# Altium footprint library Hydra_Ref_pcb.PcbLib: 353 footprints (part 11 of 23)
Each footprint in its own frame and in the unit in brackets; x right, y up, seen from the top. Pads: shape width x height; smd on the part's side, far side on the other; paste and mask are expansions set on the pad; w line width, h text height; cw(c..) or ccw(c..) is an arc to the next point about the centre after c.
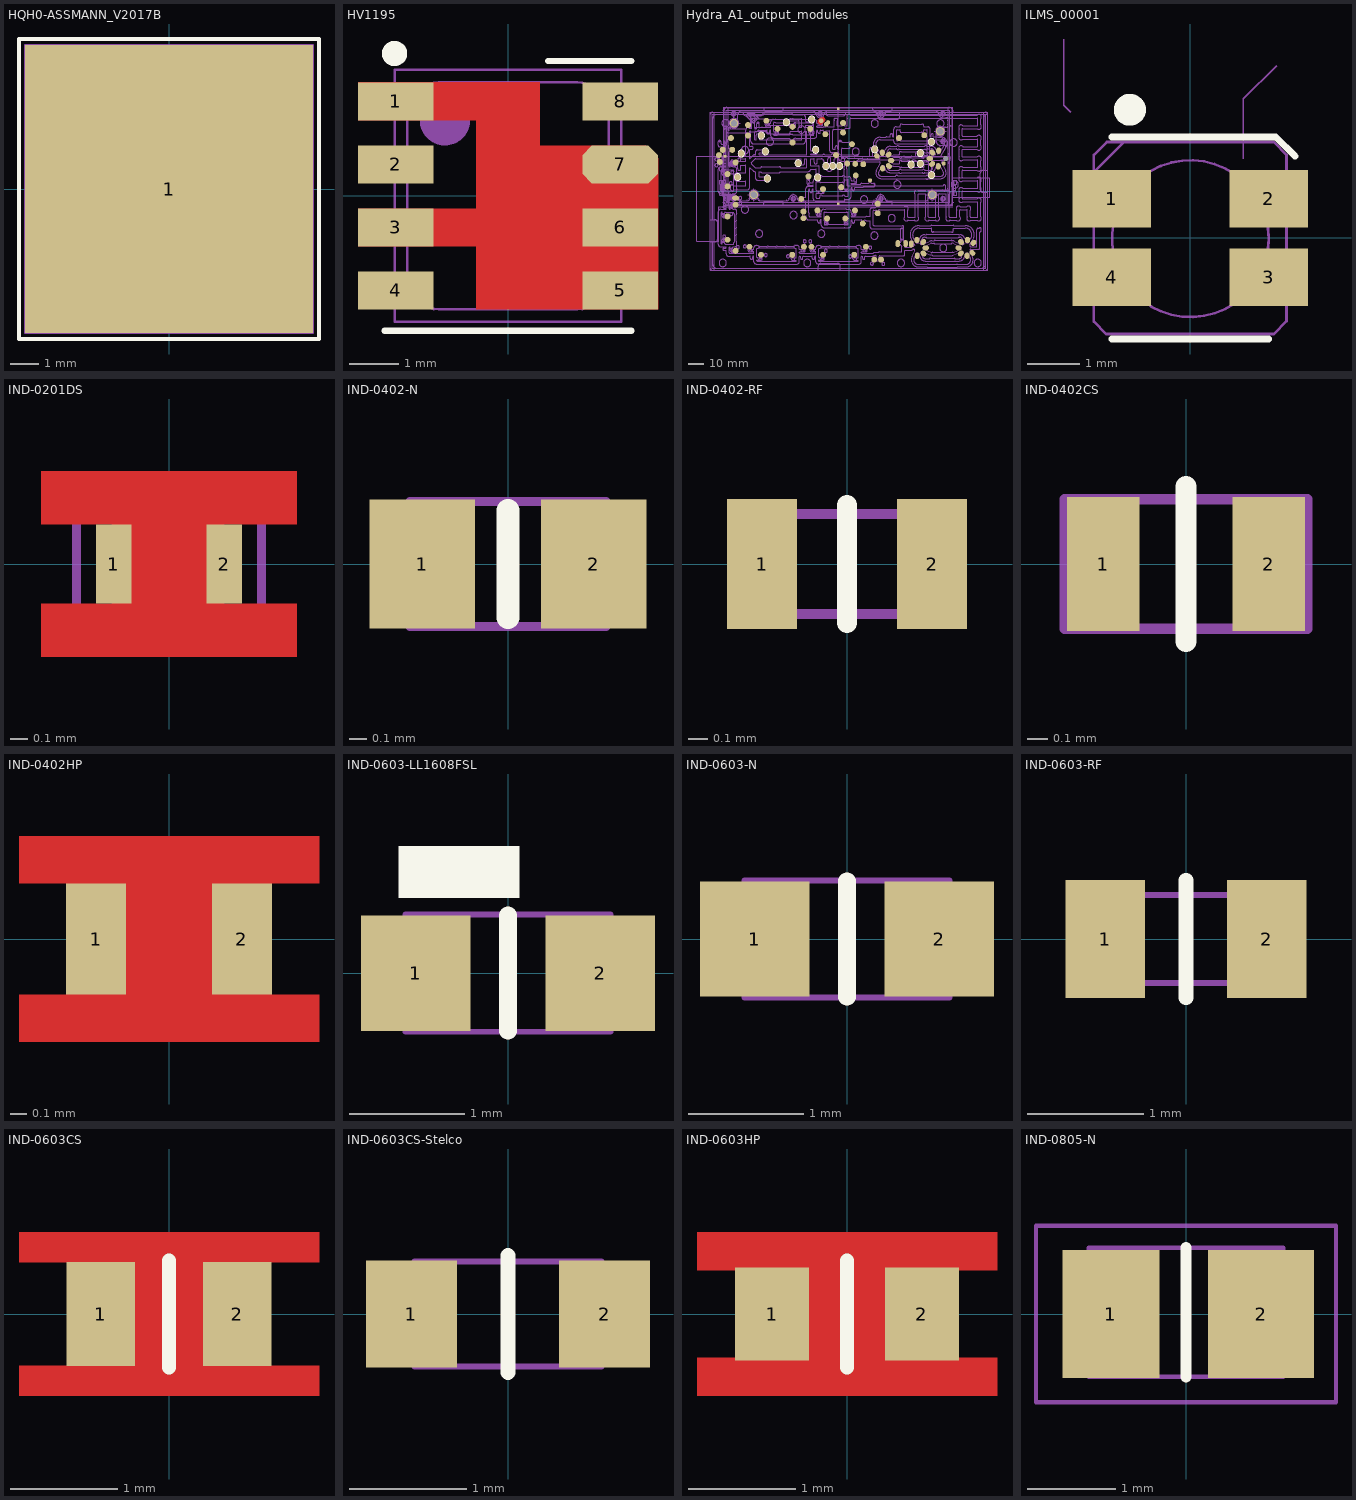
[diagram p10: the footprints below, top view; thin cyan lines are the x and y axes]

## HQH0-ASSMANN_V2017B [mm] "HEATSINK;SMT;10WX10LX7H(MM)"
height 7
pads (1):
  rect 10x10 smd: 1(0,0)
Top Overlay:
  lines w0.127: -5.2,-5.2 -5.2,5.2 5.2,5.2 5.2,-5.2 -5.2,-5.2
9 Top Assy:
  lines w0.051: -5,-5 5,-5 5,5 -5,5 -5,-5
  text ".Designator" at -2.666,-0.762 h1.52
3D body: height 7, standoff 1.8, extent -4.999,-4.999 -3.001,-3
3D body: height 7, standoff 1.8, extent -0.999,-4.999 1,-3
3D body: height 7, standoff 1.8, extent 3.001,-4.999 5,-3
3D body: height 7, standoff 1.8, extent -5,-1 -3.001,0.999
3D body: height 7, standoff 1.8, extent -0.999,-0.999 1,1
3D body: height 7, standoff 1.8, extent 3.001,-0.999 5,1
3D body: height 7, standoff 1.8, extent 3.001,3.001 5,5
3D body: height 7, standoff 1.8, extent -0.999,3.001 1,5
3D body: height 7, standoff 1.8, extent -4.999,3.001 -3.001,4.999
3D body: height 1.8, standoff 0, extent -4.999,-4.999 4.999,4.999

## HV1195 [mil] "Mini-Circuits KSX2-442+"
height 87
pads (8):
  rect 60x30 smd: 1(-89,75) 2(-89,25) 3(-89,-25) 4(-89,-75) 5(89,-75) 6(89,-25) 8(89,75)
  oct 60x30 smd: 7(89,25)
Top Layer:
  rectangle: 89,10 119,25
  rectangle: 59,10 89,40
  region: -119,90 -119,60 -25,60 -25,-10 -119,-10 -119,-40 -25,-40 -25,-90 119,-90 119,30 109,40 25,40 25,90
Top Overlay:
  circle w10: c-90,113 r5
  lines w5: -98,-107 98,-107 ; 32,107 98,107
Top Paste:
  rectangle: 89,10 119,25
  rectangle: 59,10 89,40
  region: -61,94 -61,56 -29,56 -29,-6 -61,-6 -61,-44 -30,-44 -30,-94 64,-94 64,44 30,44 30,94
Top Solder:
  region: -61,94 -61,56 -29,56 -29,-6 -61,-6 -61,-44 -30,-44 -30,-94 64,-94 64,44 30,44 30,94
9 Top Assy:
  circle w20: c-50,60 r10
  lines w2: -90,-100 90,-100 90,100 -90,100 -90,-100 ; -80,-65 ccw(c-55,-65) -55,-90 55,-90 ccw(c55,-65) 80,-65 80,65 ccw(c55,65) 55,90 -55,90 ccw(c-55,65) -80,65 -80,-65
  text ".Designator" at -60,-20 h25
3D body: height 87.01, standoff 0.39, extent -90,-100 90,100

## Hydra_A1_output_modules [mil] "Hydra A1 output modules (pad expansions/locations, mechanical features)"
height 702
pads (157):
  rect 70x70 smd paste-35 mask+0: A1-A2_shield(-3131.04,885.49) A1-A2_shield(-273.04,-314.51) A1-A2_shield(-273.04,2085.49)
  round 220 / inner round 170 / far side round 260 hole 156 mask+0: MH1(-2906.06,1720.44) MH1(-2406.06,-89.56) MH1(2103.94,-89.56) MH1(2303.94,1514.94)
  round 0 hole 136 unplated mask+0: MH_RF_OUT(2438.48,828.95)
  oval 125x160 / inner round 0 / far side oval 125x160 all layers, no hole: SW301-1(2991.08,-1231.25) SW301-5(2982.38,-1628.75) SW302-2(1713.88,-1231.25) SW302-6(1722.58,-1628.75) SW303-2(839.88,976.75) SW303-6(848.58,579.25) SW304-1(2264.58,1027.25) SW304-5(2255.88,629.75)
  rrect50% 83.33x83.33 / inner rrect50% 0x0 / far side rrect50% 83.33x83.33 all layers, no hole rot 45: SW301-1(2991.08,-1231.25) SW301-5(2982.38,-1628.75) SW302-2(1713.88,-1231.25) SW302-6(1722.58,-1628.75) SW303-2(839.88,976.75) SW303-6(848.58,579.25) SW304-1(2264.58,1027.25) SW304-5(2255.88,629.75)
  round 125 / inner round 103 / far side round 125 all layers, no hole paste-75: SW301-1(2991.08,-1231.25) SW301-2(2829.88,-1282.05) SW301-3(2766.98,-1429.55) SW301-4(2824.28,-1570.25) SW301-5(2982.38,-1628.75) SW301-6(3116.68,-1556.85) SW302-2(1713.88,-1231.25) SW302-3(1875.08,-1282.05) SW302-4(1937.98,-1429.55) SW302-5(1880.68,-1570.25) SW302-6(1722.58,-1628.75) SW303-1(703.78,892.05) SW303-2(839.88,976.75) SW303-3(1001.08,925.95) SW303-4(1063.98,778.45) SW303-5(1006.68,637.75) SW303-6(848.58,579.25) SW304-1(2264.58,1027.25) SW304-2(2103.38,976.45) SW304-3(2040.48,828.95) SW304-4(2097.78,688.25) SW304-5(2255.88,629.75) T1(3144.48,-1304.05)
  oval 125x160 / inner round 0 / far side oval 125x160 all layers, no hole rot 45: SW301-2(2829.88,-1282.05) SW301-6(3116.68,-1556.85) SW302-5(1880.68,-1570.25) SW303-5(1006.68,637.75) SW304-2(2103.38,976.45)
  rrect50% 83.33x83.33 / inner rrect50% 0x0 / far side rrect50% 83.33x83.33 all layers, no hole: SW301-2(2829.88,-1282.05) SW301-4(2824.28,-1570.25) SW301-6(3116.68,-1556.85) SW302-3(1875.08,-1282.05) SW302-5(1880.68,-1570.25) SW303-1(703.78,892.05) SW303-3(1001.08,925.95) SW303-5(1006.68,637.75) SW304-2(2103.38,976.45) SW304-4(2097.78,688.25) T1(3144.48,-1304.05)
  oval 160x125 / inner round 0 / far side oval 160x125 all layers, no hole: SW301-3(2766.98,-1429.55) SW302-4(1937.98,-1429.55) SW303-4(1063.98,778.45) SW304-3(2040.48,828.95)
  rrect50% 83.33x83.33 / inner rrect50% 0x0 / far side rrect50% 83.33x83.33 all layers, no hole rot 135: SW301-3(2766.98,-1429.55) SW302-4(1937.98,-1429.55) SW303-4(1063.98,778.45) SW304-3(2040.48,828.95)
  oval 125x160 / inner round 0 / far side oval 125x160 all layers, no hole rot 135: SW301-4(2824.28,-1570.25) SW302-3(1875.08,-1282.05) SW303-3(1001.08,925.95) SW304-4(2097.78,688.25) T1(3144.48,-1304.05)
  oval 115x180 / inner round 103 / far side oval 115x180 all layers, no hole paste-75: SW302-1(1568.68,-1330.35) T14(1429.48,-1321.55) T15(1232.48,-1321.55)
  oval 125x146 / inner round 0 / far side oval 125x146 all layers, no hole rot 45: SW303-1(703.78,892.05)
  round 103 all layers, no hole paste-60: SW304-6(2390.18,701.65)
  round 150 / inner round 103 / far side round 150 all layers, no hole paste-75: T16(807.98,-1726.55) T17(637.98,-1726.55) T19(-3069.02,124.45) T20(-3069.02,435.45) T21(-2865.02,729.95) T22(425.98,-1401.05) T23(131.48,-1605.05) T24(-654.52,-1605.05) T25(-949.02,-1401.05) T26(-1140.02,-1401.05) T27(-1434.52,-1605.05) T28(-2220.52,-1605.05) T29(-2515.02,-1401.05) T30(-2865.02,-1503.55) T31(-3069.02,-1224.05) T32(-3069.02,-634.05) T33(-2865.02,-339.55) T34(-3263.02,742.95) T35(-3288.02,912.95) T36(-2949.02,1046.95) T37(-3191.02,1046.95) T38(-2983.02,1343.45) T39(-2551.52,1408.45) T40(-2551.52,1672.95) T41(-2088.02,1781.45) T42(-1807.02,1577.45) T43(-1428.02,1627.95) T44(-1428.02,1231.45) T45(-980.52,1577.45) T47(-598.02,1440.95) T49(-150.02,1482.95) T50(-150.02,1724.95) T51(73.58,1189.45) T52(-326.52,912.95) T53(-45.52,699.95) T54(156.98,691.95) T55(359.48,683.95) T62(1264.98,1346.45) T63(1900.98,1416.45) T70(722.98,-555.05) T71(722.98,-313.05) T72(348.48,-816.55) T73(148.98,-482.05) T74(-94.02,-686.05) T75(-554.02,-686.05) T76(-797.02,-482.05) T77(-1151.02,-681.05) T78(-1151.02,-511.05) T79(-1207.02,-192.05) T80(-1024.02,374.95) T81(-656.02,53.95) T82(-199.02,103.95) T83(168.98,399.95) T85(2083.04,1248.44) T86(2082.94,408.44) T87(1802.44,963.44) T88(1802.44,693.44) T89(648.74,1059.14) T90(-2813.52,360.45) T91(-2721.56,954.94) T92(-943.56,1813.94) T93(-1582.56,1743.44) T94(-2214.86,1406.94) T95(-2112.06,1006.94) T96(-2062.06,321.94) T97(-843.56,1049.04) T98(-1283.06,709.94) T99(-791.56,350.94) T100(1570.94,673.44) T101(-239.56,638.24) T102(-412.56,638.24) T103(-585.56,638.24)
  oval 180x115 / inner round 103 / far side oval 180x115 all layers, no hole paste-75: T18(-2865.02,-170.05)
  round 115 / inner round 103 / far side oval 115x180 all layers, no hole paste-75: T46(-699.52,1781.45)
  oval 115x180 / inner round 103 / far side oval 115x180 all layers, no hole rot 135 paste-75: T48(-555.52,1714.95)
  round 103 all layers, no hole paste-75: T84(529.48,275.45)
Top Layer:
  region: -667.46,1861.24 -722.86,1839.44 -763.16,1799.14 -769.06,1792.24 -773.76,1784.54 -777.16,1776.24 -779.26,1767.44 -779.96,1758.64 -779.26,1749.34 -777.16,1740.64 -773.76,1732.34 -768.96,1724.54 -763.06,1717.74 -756.26,1711.94 -748.56,1707.24 -740.16,1703.74 -731.46,1701.64 -722.46,1700.94 -713.16,1701.74 -704.56,1703.84 -696.36,1707.24 -688.56,1712.04 -681.86,1717.84 -676.06,1723.54 -635.76,1763.84 -629.96,1770.64 -625.26,1778.44 -621.86,1786.64 -619.76,1795.44 -619.06,1804.44 -619.76,1813.54 -621.86,1822.14 -625.36,1830.64 -630.16,1838.44 -635.96,1845.14 -642.86,1851.04 -650.56,1855.74 -658.76,1859.14
  pour cut-out: -773.7,1809.67 -778.75,1804.62 -786.69,1792.74 -792.15,1779.55 -794.94,1765.54 -794.94,1751.26 -792.15,1737.25 -786.69,1724.06 -778.75,1712.18 -768.66,1702.09 -756.78,1694.15 -743.59,1688.69 -729.58,1685.9 -715.3,1685.9 -701.29,1688.69 -688.1,1694.15 -676.22,1702.09 -671.17,1707.13 -625.33,1753.23 -620.61,1757.96 -613.04,1768.99 -607.61,1781.22 -604.52,1794.24 -603.86,1807.6 -605.65,1820.85 -609.84,1833.56 -616.28,1845.28 -624.76,1855.63 -634.99,1864.25 -646.63,1870.85 -659.27,1875.22 -665.89,1876.2 -672.84,1875.24 -728.24,1853.44 -731.36,1852.25
Bottom Layer:
  region: -667.46,1861.24 -722.86,1839.44 -763.16,1799.14 -769.06,1792.24 -773.76,1784.54 -777.16,1776.24 -779.26,1767.44 -779.96,1758.64 -779.26,1749.34 -777.16,1740.64 -773.76,1732.34 -768.96,1724.54 -763.06,1717.74 -756.26,1711.94 -748.56,1707.24 -740.16,1703.74 -731.46,1701.64 -722.46,1700.94 -713.16,1701.74 -704.56,1703.84 -696.36,1707.24 -688.56,1712.04 -681.86,1717.84 -676.06,1723.54 -635.76,1763.84 -629.96,1770.64 -625.26,1778.44 -621.86,1786.64 -619.76,1795.44 -619.06,1804.44 -619.76,1813.54 -621.86,1822.14 -625.36,1830.64 -630.16,1838.44 -635.96,1845.14 -642.86,1851.04 -650.56,1855.74 -658.76,1859.14
  region: -667.46,1861.24 -722.86,1839.44 -763.16,1799.14 -769.06,1792.24 -773.76,1784.54 -777.16,1776.24 -779.26,1767.44 -779.96,1758.64 -779.26,1749.34 -777.16,1740.64 -773.76,1732.34 -768.96,1724.54 -763.06,1717.74 -756.26,1711.94 -748.56,1707.24 -740.16,1703.74 -731.46,1701.64 -722.46,1700.94 -713.16,1701.74 -704.56,1703.84 -696.36,1707.24 -688.56,1712.04 -681.86,1717.84 -676.06,1723.54 -635.76,1763.84 -629.96,1770.64 -625.26,1778.44 -621.86,1786.64 -619.76,1795.44 -619.06,1804.44 -619.76,1813.54 -621.86,1822.14 -625.36,1830.64 -630.16,1838.44 -635.96,1845.14 -642.86,1851.04 -650.56,1855.74 -658.76,1859.14
Top Overlay:
  circle w5: c2083.04,1248.44 r82.5
  circle w5: c1802.44,963.44 r82.5
  circle w5: c2082.94,408.44 r82.5
  circle w5: c1802.44,693.44 r82.5
  circle w5: c648.74,1059.14 r82.5
  circle w5: c-2813.52,360.45 r82.5
  circle w5: c-2721.56,954.94 r82.5
  circle w5: c-943.56,1813.94 r82.5
  circle w5: c-1582.56,1743.44 r82.5
  circle w5: c-2214.86,1406.94 r82.5
  circle w5: c-2112.06,1006.94 r82.5
  circle w5: c-2062.06,321.94 r82.5
  circle w5: c-843.56,1049.04 r82.5
  circle w5: c-1283.06,709.94 r82.5
  circle w5: c-791.56,350.94 r82.5
  circle w5: c1570.94,673.44 r82.5
  circle w5: c-239.56,638.24 r82.5
  circle w5: c-585.56,638.24 r82.5
  circle w5: c-412.56,638.24 r82.5
Bottom Overlay:
  drawing of 262 lines, arcs and shapes, not listed
Top Solder:
  drawing of 5 lines, arcs and shapes, not listed
Bottom Solder:
  drawing of 19 lines, arcs and shapes, not listed
12 Bott 3D Bodies:
  circle w2: c-2906.06,1720.44 r78
  circle w2: c-2906.06,1720.44 r120
  lines w5: -3500,-2000 3500,-2000 3500,1940 3450,1940 3450,-1950 -3450,-1950 -3450,1950 3500,1950 3500,2000 -3500,2000 -3500,-2000
  lines w10: -2381.29,1752.79 -2547.36,1918.86 -2540.64,1925.58 -2428.21,1925.58 -2318.36,1815.72 ; -2359.65,1774.43 -2408.16,1725.92 -2583.27,1901.03 cw(c-2565.59,1918.7) -2583.27,1936.38 -2554.47,1965.18 -2414.07,1965.17 -2291.49,1842.59 -2340,1794.08
13 Top 3D Bodies:
  lines w2: -2307.49,1733.95 -2299.52,1733.95 ; -2299.52,1725.98 -2299.52,1733.95 ; -2299.52,1741.93 -2299.52,1733.95 ; -2291.55,1733.95 -2299.52,1733.95
  lines w10: -2379.17,1754.91 -2545.24,1920.98 -2427.86,1920.98 -2320.48,1813.6 ; -2359.65,1774.43 -2415.23,1718.85 -2590.34,1893.95 cw(c-2572.66,1911.63) -2590.34,1929.31 -2554.47,1965.17 -2399.93,1965.18 -2284.42,1849.66 -2340,1794.08
Mechanical 23:
  drawing of 294 lines, arcs and shapes, not listed
Mechanical 25:
  circle w0.5: c2303.94,1514.94 r44.5
  circle w0.5: c2303.94,1514.94 r58
  circle w0.5: c2303.94,1514.94 r120
  circle w0.5: c2103.94,-89.56 r44.5
  circle w0.5: c2103.94,-89.56 r58
  circle w0.5: c2103.94,-89.56 r120
  circle w0.5: c-2906.06,1720.44 r44.5
  circle w0.5: c-2906.06,1720.44 r58
  circle w0.5: c-2906.06,1720.44 r120
  circle w0.5: c-2406.06,-89.56 r44.5
  circle w0.5: c-2406.06,-89.56 r58
  circle w0.5: c-2406.06,-89.56 r120
  lines w0.5: -3500.06,-1280.06 -3390.06,-1280.06 ccw(c-3390.06,-1210.06) -3320.06,-1210.06 -3320.06,-790.06 ccw(c-3390.06,-790.06) -3390.06,-720.06 -3500.06,-720.06 ; -3440.06,-1280.06 -3440.06,-1850.06 ccw(c-3350.06,-1850.06) -3350.06,-1940.06 -780.06,-1940.06 ; -3440.06,-720.06 -3440.06,1849.94 cw(c-3350.06,1849.94) -3350.06,1939.94 719.94,1939.94 ; -3062.06,1720.44 -2906.06,1720.44 ; -2981.46,1720.44 -2906.06,1720.44 ; -2963.91,1720.44 -2906.06,1720.44 ; -2906.06,1564.44 -2906.06,1720.44 ; -2906.06,1645.04 -2906.06,1720.44 ; -2906.06,1662.59 -2906.06,1720.44 ; -2906.06,1778.29 -2906.06,1720.44 ; -2906.06,1795.84 -2906.06,1720.44 ; -2906.06,1876.44 -2906.06,1720.44 ; -2848.21,1720.44 -2906.06,1720.44 ; -2830.66,1720.44 -2906.06,1720.44 ; -2750.06,1720.44 -2906.06,1720.44 ; -2562.06,-89.56 -2406.06,-89.56 ; -2481.46,-89.56 -2406.06,-89.56 ; -2463.91,-89.56 -2406.06,-89.56 ; -2406.06,-245.56 -2406.06,-89.56 ; -2406.06,-164.96 -2406.06,-89.56 ; -2406.06,-147.41 -2406.06,-89.56 ; -2406.06,-31.71 -2406.06,-89.56 ; -2406.06,-14.16 -2406.06,-89.56 ; -2406.06,66.44 -2406.06,-89.56 ; -2348.21,-89.56 -2406.06,-89.56 ; -2330.66,-89.56 -2406.06,-89.56 ; -2250.06,-89.56 -2406.06,-89.56 ; -780.06,-2000.06 -780.06,-1890.06 cw(c-710.06,-1890.06) -710.06,-1820.06 -290.06,-1820.06 cw(c-290.06,-1890.06) -220.06,-1890.06 -220.06,-2000.06 ; -220.06,-1940.06 3349.94,-1940.06 ccw(c3349.94,-1850.06) 3439.94,-1850.06 3439.94,-30.06 ; 719.94,1999.94 719.94,1889.94 ccw(c789.94,1889.94) 789.94,1819.94 1209.94,1819.94 ccw(c1209.94,1889.94) 1279.94,1889.94 1279.94,1999.94 ; 1279.94,1939.94 3349.94,1939.94 cw(c3349.94,1849.94) 3439.94,1849.94 3439.94,529.94 ; 1947.94,-89.56 2103.94,-89.56 ; 2028.54,-89.56 2103.94,-89.56 ; 2046.09,-89.56 2103.94,-89.56 ; 2103.94,-245.56 2103.94,-89.56 ; 2103.94,-164.96 2103.94,-89.56 ; 2103.94,-147.41 2103.94,-89.56 ; 2103.94,-31.71 2103.94,-89.56 ; 2103.94,-14.16 2103.94,-89.56 ; 2103.94,66.44 2103.94,-89.56 ; 2147.94,1514.94 2303.94,1514.94 ; 2161.79,-89.56 2103.94,-89.56 ; 2179.34,-89.56 2103.94,-89.56 ; 2228.54,1514.94 2303.94,1514.94 ; 2246.09,1514.94 2303.94,1514.94 ; 2259.94,-89.56 2103.94,-89.56 ; 2303.94,1358.94 2303.94,1514.94 ; 2303.94,1439.54 2303.94,1514.94 ; 2303.94,1457.09 2303.94,1514.94 ; 2303.94,1572.79 2303.94,1514.94 ; 2303.94,1590.34 2303.94,1514.94 ; 2303.94,1670.94 2303.94,1514.94 ; 2361.79,1514.94 2303.94,1514.94 ; 2379.34,1514.94 2303.94,1514.94 ; 2459.94,1514.94 2303.94,1514.94 ; 3499.94,-30.06 3389.94,-30.06 cw(c3389.94,39.94) 3319.94,39.94 3319.94,459.94 cw(c3389.94,459.94) 3389.94,529.94 3499.94,529.94 ; -3500.06,-1940.06 ccw(c-3440.06,-1940.06) -3440.06,-2000.06 3439.94,-2000.06 ccw(c3439.94,-1940.06) 3499.94,-1940.06 3499.94,1939.94 ccw(c3439.94,1939.94) 3439.94,1999.94 -3440.06,1999.94 ccw(c-3440.06,1939.94) -3500.06,1939.94 -3500.06,-1940.06
Mechanical 29:
  drawing of 2633 lines, arcs and shapes, not listed
  text "T35" at -3379.16,794.45 h25
  text "T34" at -3379.76,645.45 h25
  text "T17" at 546.84,-1839.55 h25
  text "T16" at 833.84,-1846.55 h25
  text "T18" at -2776.16,-182.55 h25
  text "T19" at -3018.57,189.45 h25
  text "T20" at -2984.16,463.45 h25
  text "T21" at -2801.59,785.45 h25
  text "T22" at 504.84,-1435.55 h25
  text "T23" at -3.16,-1659.55 h25
  text "T24" at -616.76,-1517.55 h25
  text "T25" at -1008.16,-1276.55 h25
  text "T26" at -1152.16,-1276.55 h25
  text "T27" at -1574.16,-1654.55 h25
  text "T28" at -2134.16,-1622.55 h25
  text "T29" at -2663.57,-1404.55 h25
  text "T30" at -2841.16,-1421.55 h25
  text "T31" at -3184.59,-1156.55 h25
  text "T32" at -3009.16,-587.55 h25
  text "T33" at -2775.16,-311.55 h25
Mechanical 30:
  drawing of 713 lines, arcs and shapes, not listed
  text "A1-A2 MODULE" at -2372.21,86.61 h90
3D body: height 422.5, standoff 47.5, extent 3500,-1160.51 3657.01,-785.5
3D body: height 359.01, standoff 110, extent 3500,-1097.78 3875,-848.28
3D body: height 422.5, standoff 47.5, extent -519,2000 -143.99,2157.01
3D body: height 359.01, standoff 110, extent -456.22,2000 -206.71,2374.99
3D body: height 359.01, standoff 110, extent -2546.72,2000 -2297.21,2375
3D body: height 422.5, standoff 47.5, extent -2609.5,2000 -2234.49,2157.01
3D body: height 500.78, standoff 0.78, extent -3500.06,-2000.05 3499.94,1999.95
3D body: height 389.77, standoff 79, extent 3865,-1129.03 5175,-817.65
3D body: height 422.5, standoff 47.5, extent -3266,-102.01 -3155,273
3D body: height 42, standoff 0, extent -2504.21,-188.8 -2305,10.81
3D body: height 42, standoff 0, extent -3005.27,1620.64 -2806.06,1820.25
3D body: height 42, standoff 0, extent 2204.73,1415.14 2403.94,1614.75
3D body: height 42, standoff 0, extent 2004.73,-189.36 2203.94,10.25
3D body: height 702, standoff 42, extent -3156.04,-339.51 2609.96,2110.49
3D body: height 42, standoff 0, extent -3156.04,-339.51 2609.96,2110.49
3D body: height 422.5, standoff 47.5, extent -3266.02,522.99 -3155,898
3D body: height 422.5, standoff 47.5, extent 2609,-102.02 2718.98,272.99
3D body: height 50.1, standoff -50.5, extent -3229,-1139.27 -3212,-1038.47

## ILMS_00001 [mm] "old part does not have a big pads as suggested in data sheet"
height 2.1
pads (4):
  rect 1.5x1.1 smd: 1(-1.5,0.75) 2(1.5,0.75) 3(1.5,-0.75) 4(-1.5,-0.75)
Top Overlay:
  circle w0.305: c-1.154,2.45 r0.152
  lines w0.127: -1.5,-1.93 1.5,-1.93 ; -1.5,1.93 1.634,1.93 2,1.564
9 Top Assy:
  circle w0.051: c0,-0.013 r1.499
  lines w0.051: -1.844,1.258 -1.268,1.834 ; -1.844,-1.6 -1.844,1.585 -1.595,1.834 1.595,1.834 1.839,1.59 1.839,-1.59 1.595,-1.834 -1.61,-1.834 -1.844,-1.6
  text ".Designator" at -1.25,-0.25 h0.71
22 Part Dimentions & Info:
  lines w0.025: -2.416,3.802 -2.416,2.532 -2.289,2.405 ; 1.013,1.516 1.013,2.659 1.648,3.294
  text "VLP-250-F" at -1.527,4.056 h0.51
  text "LATB-T66B" at 2.156,3.929 h0.51
3D body: height 2.1, standoff 0.01, extent -3.75,-3.5 3.75,3.5

## IND-0201DS [mil] "Coilcraft 0201DS"
height 18
pads (2):
  rect 8x18 smd mask+3: 1(-12.5,0) 2(12.5,0)
Top Layer:
  pour cut-out: 29,21 29,9 12.5,9 12.5,-9 29,-9 29,-21 -29,-21 -29,-9 -13,-9 -13,9 -29,9 -29,21
Top Solder:
  pour cut-out: -34,23 34,23 34,-23 -34,-23
9 Top Assy:
  lines w2: -21,-11 21,-11 21,11 -21,11 -21,-11
  text ".Designator" at -17.72,-3.94 h10
3D body: height 24, standoff 0, extent -21.5,-12 21.5,12

## IND-0402-N [mm] "METRIC 1005"
height 0.6
pads (2):
  rect 0.59x0.72 smd: 1(-0.48,0) 2(0.48,0)
Top Overlay:
  lines w0.127: 0,-0.3 0,0.3
9 Top Assy:
  lines w0.051: -0.55,-0.35 0.55,-0.35 0.55,0.35 -0.55,0.35 -0.55,-0.35
  text ".Designator" at -0.45,-0.1 h0.25
3D body: height 0.61, standoff 0.01, extent -0.95,-0.55 0.95,0.55

## IND-0402-RF [mil] "METRIC 1005"
height 24.02
pads (2):
  rect 14x26 smd: 1(-17,0) 2(17,0)
Top Overlay:
  lines w4: 0,-11.81 0,11.81
9 Top Assy:
  lines w2: -20,-10 20,-10 20,10 -20,10 -20,-10
  text ".Designator" at -15,-5 h10
3D body: height 24, standoff 0.39, extent -33.46,-21.65 31.5,21.65

## IND-0402CS [mil] "Coilcraft 0402CS SM Inductor"
height 26
pads (2):
  rect 14x26 smd mask+3: 1(-16,0) 2(16,0)
Top Overlay:
  lines w4: 0,-15 0,15
9 Top Assy:
  lines w2: -23.5,-12.5 23.5,-12.5 23.5,12.5 -23.5,12.5 -23.5,-12.5
  text ".Designator" at -17.72,-3.94 h10
3D body: height 26, standoff 0, extent -23.5,-12.5 23.5,12.5

## IND-0402HP [mil] "Coilcraft 0402HP SM Inductor 43X25X24(mil)"
height 24
pads (2):
  rect 14x26 smd mask+3: 1(-17,0) 2(17,0)
Top Layer:
  pour cut-out: 35,24 35,13 24,13 24,-13 35,-13 35,-24 -35,-24 -35,-13 -24,-13 -24,13 -35,13 -35,24
Top Solder:
  pour cut-out: -34,23 34,23 34,-23 -34,-23
9 Top Assy:
  lines w2: -21.5,-14 -21.5,14 21.5,14 21.5,-14 -21.5,-14
  text ".Designator" at -17.72,-3.94 h10
3D body: height 24, standoff 0, extent -21.5,-14 21.5,14

## IND-0603-LL1608FSL [mm] "METRIC 1608 With plarity marking"
height 0.95
pads (2):
  rect 0.95x1 smd: 1(-0.8,0) 2(0.8,0)
Top Overlay:
  rectangle: -0.95,0.65 0.1,1.1
  lines w0.152: 0,-0.5 0,0.5
9 Top Assy:
  lines w0.051: -0.889,-0.508 0.889,-0.508 0.889,0.508 -0.889,0.508 -0.889,-0.508
  text ".Designator" at -0.762,-0.127 h0.41
3D body: height 0.95, standoff 0.01, extent -1.55,-0.75 1.55,0.75

## IND-0603-N [mm] "METRIC 1608"
height 0.95
pads (2):
  rect 0.95x1 smd: 1(-0.8,0) 2(0.8,0)
Top Overlay:
  lines w0.152: 0,-0.5 0,0.5
9 Top Assy:
  lines w0.051: -0.889,-0.508 -0.889,0.508 0.889,0.508 0.889,-0.508 -0.889,-0.508
  text ".Designator" at -0.762,-0.127 h0.41
3D body: height 0.95, standoff 0, extent -0.888,-0.507 0.888,0.507

## IND-0603-RF [mil]
height 70
pads (2):
  rect 27x40 smd: 1(-27.5,0) 2(27.5,0)
Top Overlay:
  lines w5: 0,-20 0,20
Top Solder:
  pour cut-out: -51,-30 51,-30 51,30 -51,30
9 Top Assy:
  lines w2: -30,-15 -30,15 30,15 30,-15 -30,-15
  text ".Designator" at -26,-8 h15

## IND-0603CS [mil] "Coilcraft 0603CS SM Inductor 71X44X40(mil)"
height 40
pads (2):
  rect 25x38 smd: 1(-25,0) 2(25,0)
Top Layer:
  pour cut-out: 55,30 55,19 37,19 37,-19 55,-19 55,-30 -55,-30 -55,-19 -37,-19 -37,19 -55,19 -55,30
Top Overlay:
  lines w5: 0,-19.68 0,19.68
Top Solder:
  pour cut-out: -49,-30 49,-30 49,30 -49,30
9 Top Assy:
  lines w2: -35,-21 35,-21 35,21 -35,21 -35,-21
  text ".Designator" at -19,-6 h15
3D body: height 40, standoff 0, extent -35,-21 35,21

## IND-0603CS-Stelco [mm] "Stelco 0603 inductor 5516 0158451"
height 1.016
pads (2):
  rect 0.78x0.914 smd: 1(-0.825,0) 2(0.825,0)
Top Overlay:
  lines w0.127: 0,-0.5 0,0.5
9 Top Assy:
  lines w0.051: -0.8,-0.45 0.8,-0.45 0.8,0.45 -0.8,0.45 -0.8,-0.45
  text ".Designator" at -0.8,-0.25 h0.46
3D body: height 1.02, standoff 0.01, extent -1.499,-0.7 1.448,0.686

## IND-0603HP [mil] "Coilcraft 0603HP SM Inductor 69X43X37(mil)"
height 37
pads (2):
  rect 27x34 smd: 1(-27.5,0) 2(27.5,0)
Top Layer:
  pour cut-out: 55,30 55,16 41,16 41,-16 55,-16 55,-30 -55,-30 -55,-16 -41,-16 -41,16 -55,16 -55,30
Top Overlay:
  lines w5: 0,-19.68 0,19.68
Top Solder:
  pour cut-out: -52,28 52,28 52,-28 -52,-28
9 Top Assy:
  lines w2: -34.5,-21.5 -34.5,21.5 34.5,21.5 34.5,-21.5 -34.5,-21.5
  text ".Designator" at -31,-7 h15
3D body: height 37, standoff 0, extent -34.5,-21.5 34.5,21.5

## IND-0805-N [mm]
height 1.3
pads (2):
  rect 1.1x1.45 smd mask+0.076: 1(-0.85,0)
  rect 1.2x1.45 smd mask+0.076: 2(0.85,0)
Top Overlay:
  lines w0.127: 0,-0.711 0,0.75
9 Top Assy:
  lines w0.051: -1.1,-0.711 1.1,-0.711 1.1,0.75 -1.1,0.75 -1.1,-0.711
  text ".Designator" at -0.9,-0.25 h0.5
13 Top 3D Bodies:
  lines w0.051: -1.7,-1 -1.7,1 1.7,1 1.7,-1 -1.7,-1
3D body: height 1.3, standoff 0.01, extent -1.7,-1 1.7,1